# Altium schematic symbol library Sang_library.SchLib: 1607 symbols (part 12 of 15)
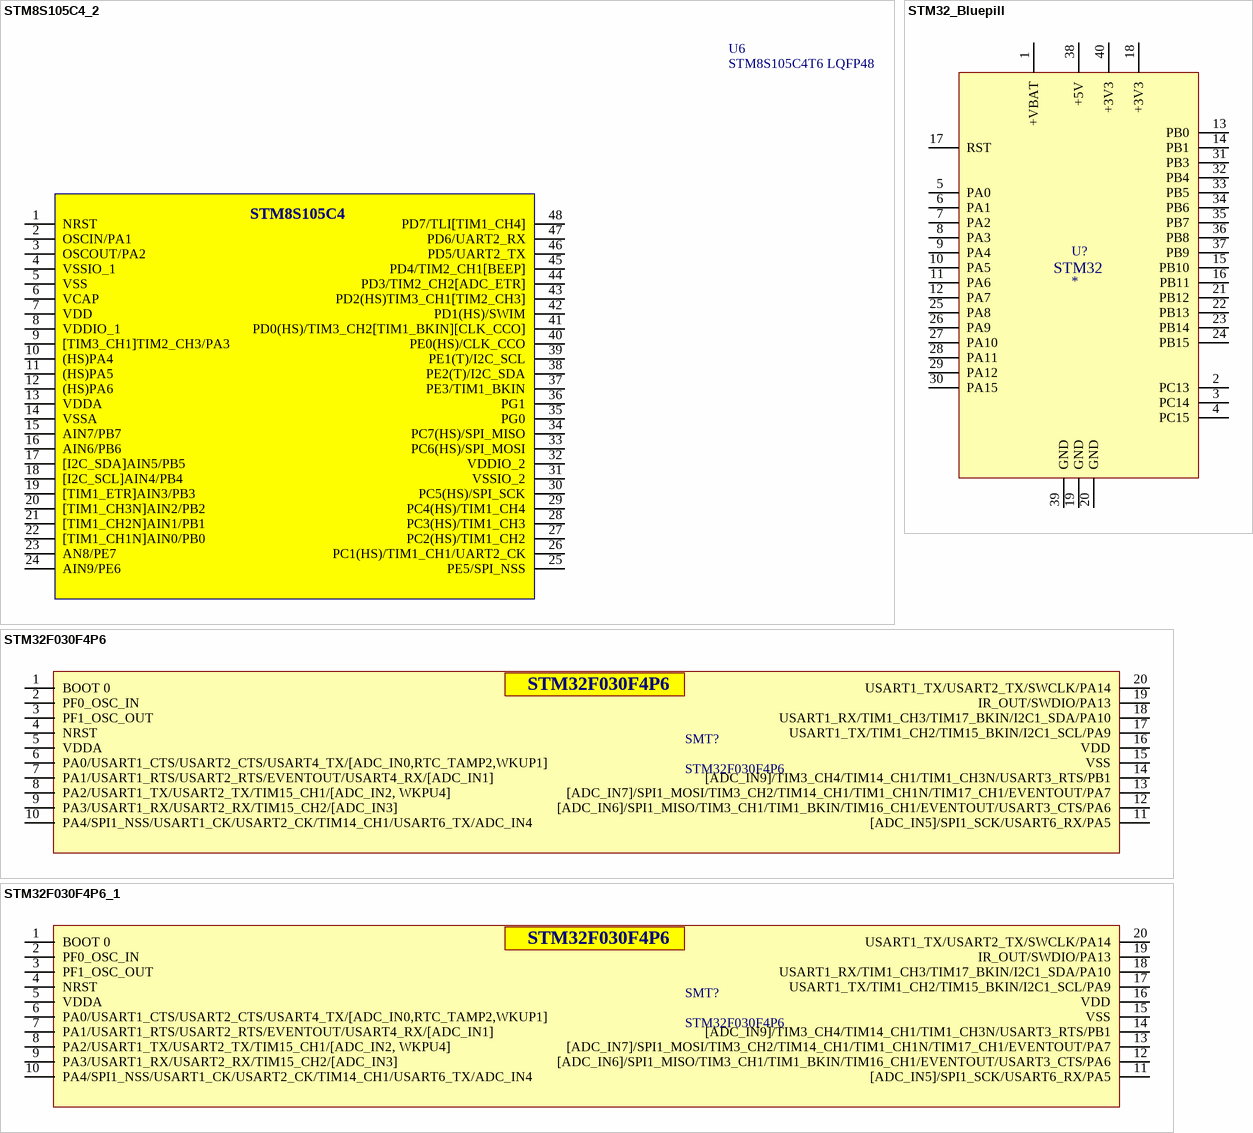
[diagram p108: symbols STM8S105C4_2 to STM32F030F4P6_1]

## STM32F030F4P6
designator SMT?
footprint TSSOP20 (Shrink Small Outline; 20 Leads; Body Width 4.4 mm; Pitch 0.65 mm)
pins: 1 BOOT 0, 2 PF0_OSC_IN, 3 PF1_OSC_OUT, 4 NRST, 5 VDDA, 6 PA0/USART1_CTS/USART2_CTS/USART4_TX/[ADC_IN0,RTC_TAMP2,WKUP1], 7 PA1/USART1_RTS/USART2_RTS/EVENTOUT/USART4_RX/[ADC_IN1], 8 PA2/USART1_TX/USART2_TX/TIM15_CH1/[ADC_IN2, WKPU4], 9 PA3/USART1_RX/USART2_RX/TIM15_CH2/[ADC_IN3], 10 PA4/SPI1_NSS/USART1_CK/USART2_CK/TIM14_CH1/USART6_TX/ADC_IN4, 11 [ADC_IN5]/SPI1_SCK/USART6_RX/PA5, 12 [ADC_IN6]/SPI1_MISO/TIM3_CH1/TIM1_BKIN/TIM16_CH1/EVENTOUT/USART3_CTS/PA6, 13 [ADC_IN7]/SPI1_MOSI/TIM3_CH2/TIM14_CH1/TIM1_CH1N/TIM17_CH1/EVENTOUT/PA7, 14 [ADC_IN9]/TIM3_CH4/TIM14_CH1/TIM1_CH3N/USART3_RTS/PB1, 15 VSS, 16 VDD, 17 USART1_TX/TIM1_CH2/TIM15_BKIN/I2C1_SCL/PA9, 18 USART1_RX/TIM1_CH3/TIM17_BKIN/I2C1_SDA/PA10, 19 IR_OUT/SWDIO/PA13, 20 USART1_TX/USART2_TX/SWCLK/PA14

## STM32F030F4P6_1
designator SMT?, comment STM32F030F4P6
footprint TSSOP20 (Shrink Small Outline; 20 Leads; Body Width 4.4 mm; Pitch 0.65 mm)
pins: 1 BOOT 0, 2 PF0_OSC_IN, 3 PF1_OSC_OUT, 4 NRST, 5 VDDA, 6 PA0/USART1_CTS/USART2_CTS/USART4_TX/[ADC_IN0,RTC_TAMP2,WKUP1], 7 PA1/USART1_RTS/USART2_RTS/EVENTOUT/USART4_RX/[ADC_IN1], 8 PA2/USART1_TX/USART2_TX/TIM15_CH1/[ADC_IN2, WKPU4], 9 PA3/USART1_RX/USART2_RX/TIM15_CH2/[ADC_IN3], 10 PA4/SPI1_NSS/USART1_CK/USART2_CK/TIM14_CH1/USART6_TX/ADC_IN4, 11 [ADC_IN5]/SPI1_SCK/USART6_RX/PA5, 12 [ADC_IN6]/SPI1_MISO/TIM3_CH1/TIM1_BKIN/TIM16_CH1/EVENTOUT/USART3_CTS/PA6, 13 [ADC_IN7]/SPI1_MOSI/TIM3_CH2/TIM14_CH1/TIM1_CH1N/TIM17_CH1/EVENTOUT/PA7, 14 [ADC_IN9]/TIM3_CH4/TIM14_CH1/TIM1_CH3N/USART3_RTS/PB1, 15 VSS, 16 VDD, 17 USART1_TX/TIM1_CH2/TIM15_BKIN/I2C1_SCL/PA9, 18 USART1_RX/TIM1_CH3/TIM17_BKIN/I2C1_SDA/PA10, 19 IR_OUT/SWDIO/PA13, 20 USART1_TX/USART2_TX/SWCLK/PA14

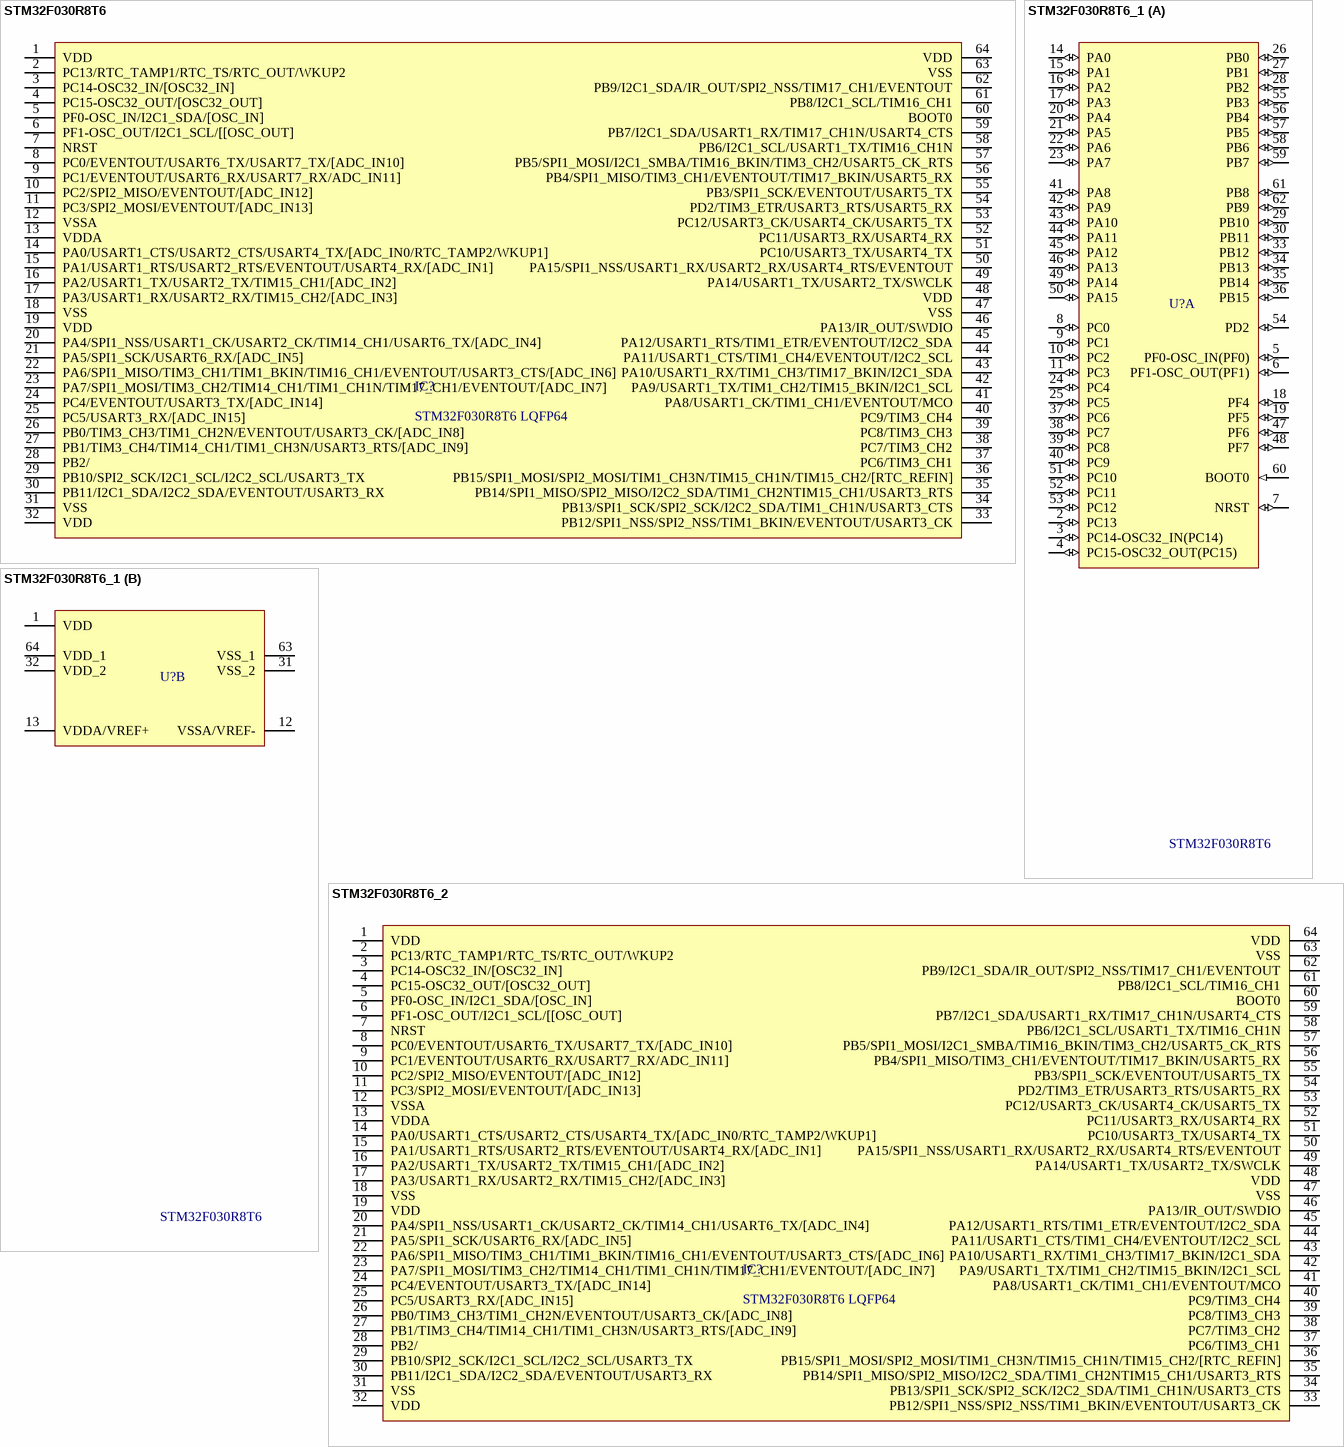
[diagram p75: symbols STM32F030R8T6 to STM32F030R8T6_2]

## STM32F030R8T6
designator IC?, comment STM32F030R8T6 LQFP64
Dán; Ghi_Chu: Con; Ma_Hang: MH005689; Ten_Linh_Kien: STM32F030R8T6 LQFP64; Don_Vi: *; Kieu_Chan: *; Chung_Loai: Dán
pins: 1 VDD, 2 PC13/RTC_TAMP1/RTC_TS/RTC_OUT/WKUP2, 3 PC14-OSC32_IN/[OSC32_IN], 4 PC15-OSC32_OUT/[OSC32_OUT], 5 PF0-OSC_IN/I2C1_SDA/[OSC_IN], 6 PF1-OSC_OUT/I2C1_SCL/[[OSC_OUT], 7 NRST, 8 PC0/EVENTOUT/USART6_TX/USART7_TX/[ADC_IN10], 9 PC1/EVENTOUT/USART6_RX/USART7_RX/ADC_IN11], 10 PC2/SPI2_MISO/EVENTOUT/[ADC_IN12], 11 PC3/SPI2_MOSI/EVENTOUT/[ADC_IN13], 12 VSSA, 13 VDDA, 14 PA0/USART1_CTS/USART2_CTS/USART4_TX/[ADC_IN0/RTC_TAMP2/WKUP1], 15 PA1/USART1_RTS/USART2_RTS/EVENTOUT/USART4_RX/[ADC_IN1], 16 PA2/USART1_TX/USART2_TX/TIM15_CH1/[ADC_IN2], 17 PA3/USART1_RX/USART2_RX/TIM15_CH2/[ADC_IN3], 18 VSS, 19 VDD, 20 PA4/SPI1_NSS/USART1_CK/USART2_CK/TIM14_CH1/USART6_TX/[ADC_IN4], 21 PA5/SPI1_SCK/USART6_RX/[ADC_IN5], 22 PA6/SPI1_MISO/TIM3_CH1/TIM1_BKIN/TIM16_CH1/EVENTOUT/USART3_CTS/[ADC_IN6], 23 PA7/SPI1_MOSI/TIM3_CH2/TIM14_CH1/TIM1_CH1N/TIM17_CH1/EVENTOUT/[ADC_IN7], 24 PC4/EVENTOUT/USART3_TX/[ADC_IN14], 25 PC5/USART3_RX/[ADC_IN15], 26 PB0/TIM3_CH3/TIM1_CH2N/EVENTOUT/USART3_CK/[ADC_IN8], 27 PB1/TIM3_CH4/TIM14_CH1/TIM1_CH3N/USART3_RTS/[ADC_IN9], 28 PB2/, 29 PB10/SPI2_SCK/I2C1_SCL/I2C2_SCL/USART3_TX, 30 PB11/I2C1_SDA/I2C2_SDA/EVENTOUT/USART3_RX, 31 VSS, 32 VDD, 33 PB12/SPI1_NSS/SPI2_NSS/TIM1_BKIN/EVENTOUT/USART3_CK, 34 PB13/SPI1_SCK/SPI2_SCK/I2C2_SDA/TIM1_CH1N/USART3_CTS, 35 PB14/SPI1_MISO/SPI2_MISO/I2C2_SDA/TIM1_CH2NTIM15_CH1/USART3_RTS, 36 PB15/SPI1_MOSI/SPI2_MOSI/TIM1_CH3N/TIM15_CH1N/TIM15_CH2/[RTC_REFIN], 37 PC6/TIM3_CH1, 38 PC7/TIM3_CH2, 39 PC8/TIM3_CH3, 40 PC9/TIM3_CH4, 41 PA8/USART1_CK/TIM1_CH1/EVENTOUT/MCO, 42 PA9/USART1_TX/TIM1_CH2/TIM15_BKIN/I2C1_SCL, 43 PA10/USART1_RX/TIM1_CH3/TIM17_BKIN/I2C1_SDA, 44 PA11/USART1_CTS/TIM1_CH4/EVENTOUT/I2C2_SCL, 45 PA12/USART1_RTS/TIM1_ETR/EVENTOUT/I2C2_SDA, 46 PA13/IR_OUT/SWDIO, 47 VSS, 48 VDD, 49 PA14/USART1_TX/USART2_TX/SWCLK, 50 PA15/SPI1_NSS/USART1_RX/USART2_RX/USART4_RTS/EVENTOUT, 51 PC10/USART3_TX/USART4_TX, 52 PC11/USART3_RX/USART4_RX, 53 PC12/USART3_CK/USART4_CK/USART5_TX, 54 PD2/TIM3_ETR/USART3_RTS/USART5_RX, 55 PB3/SPI1_SCK/EVENTOUT/USART5_TX, 56 PB4/SPI1_MISO/TIM3_CH1/EVENTOUT/TIM17_BKIN/USART5_RX, 57 PB5/SPI1_MOSI/I2C1_SMBA/TIM16_BKIN/TIM3_CH2/USART5_CK_RTS, 58 PB6/I2C1_SCL/USART1_TX/TIM16_CH1N, 59 PB7/I2C1_SDA/USART1_RX/TIM17_CH1N/USART4_CTS, 60 BOOT0, 61 PB8/I2C1_SCL/TIM16_CH1, 62 PB9/I2C1_SDA/IR_OUT/SPI2_NSS/TIM17_CH1/EVENTOUT, 63 VSS, 64 VDD

## STM32F030R8T6_1
designator U?, comment STM32F030R8T6
IC MCU 32BIT 64KB FLASH 64LQFP; MPN: STM32F030R8T6TR; Solder: SMT; Value: STM32F030R8T6; Category: IC
footprint LQFP-64 (Low Profile Quad Flat Pack (LQFP), 0.50 mm pitch; square, 16 pin X 16 pin, 10.00 mm L X 10.00 mm W X 1.60 mm H body)
part A pins: 2 PC13 (io) "PC13/TIM1_CH1N/WKUP2,RTC_TAMP1,RTC_TS,RTC_OUT", 3 PC14-OSC32_IN(PC14) (io) "PC14-OSC32_IN(PC14)/OSC32_IN", 4 PC15-OSC32_OUT(PC15) (io) "PC15-OSC32_OUT(PC15)/OSC32_OUT", 5 PF0-OSC_IN(PF0) (io) "PF0-OSC_IN(PF0)/TIM1_CH3N,I2C2_SDA/OSC_IN", 6 PF1-OSC_OUT(PF1) (io) "PF1-OSC_OUT(PF1)/I2C2_SCL/OSC_OUT", 7 NRST (io) "Device reset input / internal reset output (active low)", 8 PC0 (io) "PC0/EVENTOUT/ADC12_IN6,COMP7_INM", 9 PC1 (io) "PC1/EVENTOUT/ADC12_IN7,COMP7_INP", 10 PC2 (io) "PC2/COMP7_OUT,EVENTOUT/ADC12_IN8", 11 PC3 (io) "PC3/TIM1_BKIN2,EVENTOUT/ADC12_IN9", 14 PA0 (io) "PA0/USART2_CTS,TIM2_CH1_ETR,TIM8_BKIN,TIM8_ETR,TSC_G1_IO1,COMP1_OUT,EVENTOUT/ADC1_IN1,COMP1_INM,RTC_TAMP2,WKUP1,COMP7_INP", 15 PA1 (io) "PA1/USART2_RTS,TIM2_CH2,TSC_G1_IO2,TIM15_CH1N,RTC_REFIN,EVENTOUT/ADC1_IN2,COMP1_INP,OPAMP1_VINP,OPAMP3_VINP", 16 PA2 (io) "PA2/USART2_TX,TIM2_CH3,TIM15_CH1,TSC_G1_IO3,COMP2_OUT,EVENTOUT/ADC1_IN3,COMP2_INM,OPAMP1_VOUT", 17 PA3 (io) "PA3/USART2_RX,TIM2_CH4,TIM15_CH2,TSC_G1_IO4,EVENTOUT/ADC1_IN4,OPAMP1_VINP,COMP2_INP,OPAMP1_VINM", 18 PF4 (io) "PF4/COMP1_OUT,EVENTOUT/ADC1_IN5", 19 PF5 (io) "PF4/COMP1_OUT,EVENTOUT/ADC1_IN5", 20 PA4 (io) "PA4/SPI1_NSS,SPI3_NSS,I2S3_WS,USART2_CK,TSC_G2_IO1,TIM3_CH2,EVENTOUT/ADC2_IN1,DAC1_OUT1,OPAMP4_VINP,COMP1_INM,COMP2_INM,COMP3_INM,COMP4_INM,COMP5_INM,COMP6_INM,COMP7_INM", 21 PA5 (io) "PA5/SPI1_SCK,TIM2_CH1_ETR,TSC_G2_IO2,EVENTOUT/ADC2_IN2,DAC1_OUT2,OPAMP1_VINP,OPAMP2_VINM,OPAMP3_VINP,COMP1_INM,COMP2_INM,COMP3_INM,COMP4_INM,COMP5_INM,COMP6_INM,COMP7_INM", 22 PA6 (io) "PA6/SPI1_MISO,TIM3_CH1,TIM8_BKIN,TIM1_BKIN,TIM16_CH1,COMP1_OUT,TSC_G2_IO3,EVENTOUT/ADC2_IN3,OPAMP2_VOUT", 23 PA7 (io) "PA7/SPI1_MOSI,TIM3_CH2,TIM17_CH1,TIM1_CH1N,TIM8_CH1N,TSC_G2_IO4,COMP2_OUT,EVENTOUT/ADC2_IN4,COMP2_INP,OPAMP2_VINP,OPAMP1_VINP", 24 PC4 (io) "PC4/USART1_TX,EVENTOUT/ADC2_IN5", 25 PC5 (io) "PC5/USART1_RX,TSC_G3_IO1,EVENTOUT/ADC2_IN11,OPAMP2_VINM,OPAMP1_VINM", 26 PB0 (io) "PB0/TIM3_CH3,TIM1_CH2N,TIM8_CH2N,TSC_G3_IO2,EVENTOUT/ADC3_IN12,COMP4_INP,OPAMP3_VINP,OPAMP2_VINP", 27 PB1 (io) "PB1/TIM3_CH4,TIM1_CH3N,TIM8_CH3N,COMP4_OUT,TSC_G3_IO3,EVENTOUT/ADC3_IN1,OPAMP3_VOUT", 28 PB2 (io) "PB2/TSC_G3_IO4,EVENTOUT/ADC2_IN12,COMP4_INM,OPAMP3_VINM", 29 PB10 (io) "PB10/USART3_TX,TIM2_CH3,TSC_SYNC,EVENTOUT/COMP5_INM,OPAMP4_VINM,OPAMP3_VINM", 30 PB11 (io) "PB11/USART3_RX,TIM2_CH4,TSC_G6_IO1,EVENTOUT/COMP6_INP,OPAMP4_VINP", 33 PB12 (io) "PB12/SPI2_NSS,I2S2_WS,I2C2_SMBA,USART3_CK,TIM1_BKIN,TSC_G6_IO2,EVENTOUT/ADC4_IN3,COMP3_INM,OPAMP4_VOUT", 34 PB13 (io) "PB13/SPI2_SCK,I2S2_CK,USART3_CTS,TIM1_CH1N,TSC_G6_IO3,EVENTOUT/ADC3_IN5,COMP5_INP,OPAMP4_VINP,OPAMP3_VINP", 35 PB14 (io) "PB14/SPI2_MISO,I2S2ext_SD,USART3_RTS,TIM1_CH2N,TIM15_CH1,TSC_G6_IO4,EVENTOUT/COMP3_INP,ADC4_IN4,OPAMP2_VINP", 36 PB15 (io) "PB15/SPI2_MOSI,I2S2_SD,TIM1_CH3N,RTC_REFIN,TIM15_CH1N,TIM15_CH2,EVENTOUT/ADC4_IN5,COMP6_INM", 37 PC6 (io) "PC6/I2S2_MCK,COMP6_OUT,TIM8_CH1,TIM3_CH1,EVENTOUT", 38 PC7 (io) "PC7/I2S3_MCK,TIM8_CH2,TIM3_CH2,COMP5_OUT,EVENTOUT", 39 PC8 (io) "PC8/TIM8_CH3,TIM3_CH3,COMP3_OUT,EVENTOUT", 40 PC9 (io) "PC9/TIM8_CH4,TIM8_BKIN2,TIM3_CH4,I2S_CKIN,EVENTOUT", 41 PA8 (io) "PA8/I2C2_SMBA,I2S2_MCK,USART1_CK,TIM1_CH1,TIM4_ETR,MCO,COMP3_OUT,EVENTOUT", 42 PA9 (io) "PA9/I2C2_SCL,I2S3_MCK,USART1_TX,TIM1_CH2,TIM2_CH3,TIM15_BKIN,TSC_G4_IO1,COMP5_OUT,EVENTOUT", 43 PA10 (io) "PA10/I2C2_SDA,USART1_RX,TIM1_CH3,TIM2_CH4,TIM8_BKIN,TIM17_BKIN,TSC_G4_IO2,COMP6_OUT,EVENTOUT", 44 PA11 (io) "PA11/USART1_CTS,USB_DM,CAN_RX,TIM1_CH1N,TIM1_CH4,TIM1_BKIN2,TIM4_CH1,COMP1_OUT,EVENTOUT", 45 PA12 (io) "PA12/USART1_RTS,USB_DP,CAN_TX,TIM1_CH2N,TIM1_ETR,TIM4_CH2,TIM16_CH1,COMP2_OUT,EVENTOUT", 46 PA13 (io) "PA13/USART3_CTS,TIM4_CH3,TIM16_CH1N,TSC_G4_IO3,IR_OUT,SWDIO-JTMS,EVENTOUT", 47 PF6 (io) "PF4/COMP1_OUT,EVENTOUT/ADC1_IN5", 48 PF7 (io) "PF4/COMP1_OUT,EVENTOUT/ADC1_IN5", 49 PA14 (io) "PA14/I2C1_SDA,USART2_TX,TIM8_CH2,TIM1_BKIN,TSC_G4_IO4,SWCLK-JTCK,EVENTOUT", 50 PA15 (io) "PA15/I2C1_SCL,SPI1_NSS,SPI3_NSS,I2S3_WS,JTDI,USART2_RX,TIM1_BKIN,TIM2_CH1_ETR,TIM8_CH1,EVENTOUT", 51 PC10 (io) "PC10/SPI3_SCK,I2S3_CK,USART3_TX,UART4_TX,TIM8_CH1N,EVENTOUT", 52 PC11 (io) "PC11/SPI3_MISO,I2S3ext_SD,USART3_RX,UART4_RX,TIM8_CH2N,EVENTOUT", 53 PC12 (io) "PC12/SPI3_MOSI,I2S3_SD,USART3_CK,UART5_TX,TIM8_CH3N,EVENTOUT", 54 PD2 (io) "PD2/UART5_RX,TIM3_ETR,TIM8_BKIN,EVENTOUT", 55 PB3 (io) "PB3/SPI3_SCK,I2S3_CK,SPI1_SCK,USART2_TX,TIM2_CH2,TIM3_ETR,TIM4_ETR,TIM8_CH1N,TSC_G5_IO1,JTDO-TRACESWO,EVENTOUT", 56 PB4 (io) "PB4/SPI3_MISO,I2S3ext_SD,SPI1_MISO,USART2_RX,TIM3_CH1,TIM16_CH1,TIM17_BKIN,TIM8_CH2N,TSC_G5_IO2,NJTRST,EVENTOUT", 57 PB5 (io) "PB5/SPI3_MOSI,SPI1_MOSI,I2S3_SD,I2C1_SMBA,USART2_CK,TIM16_BKIN,TIM3_CH2,TIM8_CH3N,TIM17_CH1,EVENTOUT", 58 PB6 (io) "PB6/I2C1_SCL,USART1_TX,TIM16_CH1N,TIM4_CH1,TIM8_CH1,TSC_G5_IO3,TIM8_ETR,TIM8_BKIN2,EVENTOUT", 59 PB7 (io) "PB7/I2C1_SDA,USART1_RX,TIM3_CH4,TIM4_CH2,TIM17_CH1N,TIM8_BKIN,TSC_G5_IO4,EVENTOUT", 60 BOOT0 (in) "Boot memory selection", 61 PB8 (io) "PB8/I2C1_SCL,CAN_RX,TIM16_CH1,TIM4_CH3,TIM8_CH2,TIM1_BKIN,TSC_SYNC,COMP1_OUT,EVENTOUT", 62 PB9 (io) "PB9/I2C1_SDA,CAN_TX,TIM17_CH1,TIM4_CH4,TIM8_CH3,IR_OUT,COMP2_OUT,EVENTOUT"
part B pins: 1 VDD (power) "Backup power supply", 12 VSSA/VREF- (power) "Analog ground/Negative reference voltage", 13 VDDA/VREF+ (power) "Analog power supply/Positive reference voltage", 31 VSS_2 (power) "Digital ground", 32 VDD_2 (power) "Digital power supply", 63 VSS_1 (power) "Ground", 64 VDD_1 (power) "Digital power supply"

## STM32F030R8T6_2
designator IC?, comment STM32F030R8T6 LQFP64
Dán; Ghi_Chu: Con; Ma_Hang: MH005689; Ten_Linh_Kien: STM32F030R8T6 LQFP64; Don_Vi: *; Kieu_Chan: *; Chung_Loai: Dán
pins: 1 VDD, 2 PC13/RTC_TAMP1/RTC_TS/RTC_OUT/WKUP2, 3 PC14-OSC32_IN/[OSC32_IN], 4 PC15-OSC32_OUT/[OSC32_OUT], 5 PF0-OSC_IN/I2C1_SDA/[OSC_IN], 6 PF1-OSC_OUT/I2C1_SCL/[[OSC_OUT], 7 NRST, 8 PC0/EVENTOUT/USART6_TX/USART7_TX/[ADC_IN10], 9 PC1/EVENTOUT/USART6_RX/USART7_RX/ADC_IN11], 10 PC2/SPI2_MISO/EVENTOUT/[ADC_IN12], 11 PC3/SPI2_MOSI/EVENTOUT/[ADC_IN13], 12 VSSA, 13 VDDA, 14 PA0/USART1_CTS/USART2_CTS/USART4_TX/[ADC_IN0/RTC_TAMP2/WKUP1], 15 PA1/USART1_RTS/USART2_RTS/EVENTOUT/USART4_RX/[ADC_IN1], 16 PA2/USART1_TX/USART2_TX/TIM15_CH1/[ADC_IN2], 17 PA3/USART1_RX/USART2_RX/TIM15_CH2/[ADC_IN3], 18 VSS, 19 VDD, 20 PA4/SPI1_NSS/USART1_CK/USART2_CK/TIM14_CH1/USART6_TX/[ADC_IN4], 21 PA5/SPI1_SCK/USART6_RX/[ADC_IN5], 22 PA6/SPI1_MISO/TIM3_CH1/TIM1_BKIN/TIM16_CH1/EVENTOUT/USART3_CTS/[ADC_IN6], 23 PA7/SPI1_MOSI/TIM3_CH2/TIM14_CH1/TIM1_CH1N/TIM17_CH1/EVENTOUT/[ADC_IN7], 24 PC4/EVENTOUT/USART3_TX/[ADC_IN14], 25 PC5/USART3_RX/[ADC_IN15], 26 PB0/TIM3_CH3/TIM1_CH2N/EVENTOUT/USART3_CK/[ADC_IN8], 27 PB1/TIM3_CH4/TIM14_CH1/TIM1_CH3N/USART3_RTS/[ADC_IN9], 28 PB2/, 29 PB10/SPI2_SCK/I2C1_SCL/I2C2_SCL/USART3_TX, 30 PB11/I2C1_SDA/I2C2_SDA/EVENTOUT/USART3_RX, 31 VSS, 32 VDD, 33 PB12/SPI1_NSS/SPI2_NSS/TIM1_BKIN/EVENTOUT/USART3_CK, 34 PB13/SPI1_SCK/SPI2_SCK/I2C2_SDA/TIM1_CH1N/USART3_CTS, 35 PB14/SPI1_MISO/SPI2_MISO/I2C2_SDA/TIM1_CH2NTIM15_CH1/USART3_RTS, 36 PB15/SPI1_MOSI/SPI2_MOSI/TIM1_CH3N/TIM15_CH1N/TIM15_CH2/[RTC_REFIN], 37 PC6/TIM3_CH1, 38 PC7/TIM3_CH2, 39 PC8/TIM3_CH3, 40 PC9/TIM3_CH4, 41 PA8/USART1_CK/TIM1_CH1/EVENTOUT/MCO, 42 PA9/USART1_TX/TIM1_CH2/TIM15_BKIN/I2C1_SCL, 43 PA10/USART1_RX/TIM1_CH3/TIM17_BKIN/I2C1_SDA, 44 PA11/USART1_CTS/TIM1_CH4/EVENTOUT/I2C2_SCL, 45 PA12/USART1_RTS/TIM1_ETR/EVENTOUT/I2C2_SDA, 46 PA13/IR_OUT/SWDIO, 47 VSS, 48 VDD, 49 PA14/USART1_TX/USART2_TX/SWCLK, 50 PA15/SPI1_NSS/USART1_RX/USART2_RX/USART4_RTS/EVENTOUT, 51 PC10/USART3_TX/USART4_TX, 52 PC11/USART3_RX/USART4_RX, 53 PC12/USART3_CK/USART4_CK/USART5_TX, 54 PD2/TIM3_ETR/USART3_RTS/USART5_RX, 55 PB3/SPI1_SCK/EVENTOUT/USART5_TX, 56 PB4/SPI1_MISO/TIM3_CH1/EVENTOUT/TIM17_BKIN/USART5_RX, 57 PB5/SPI1_MOSI/I2C1_SMBA/TIM16_BKIN/TIM3_CH2/USART5_CK_RTS, 58 PB6/I2C1_SCL/USART1_TX/TIM16_CH1N, 59 PB7/I2C1_SDA/USART1_RX/TIM17_CH1N/USART4_CTS, 60 BOOT0, 61 PB8/I2C1_SCL/TIM16_CH1, 62 PB9/I2C1_SDA/IR_OUT/SPI2_NSS/TIM17_CH1/EVENTOUT, 63 VSS, 64 VDD

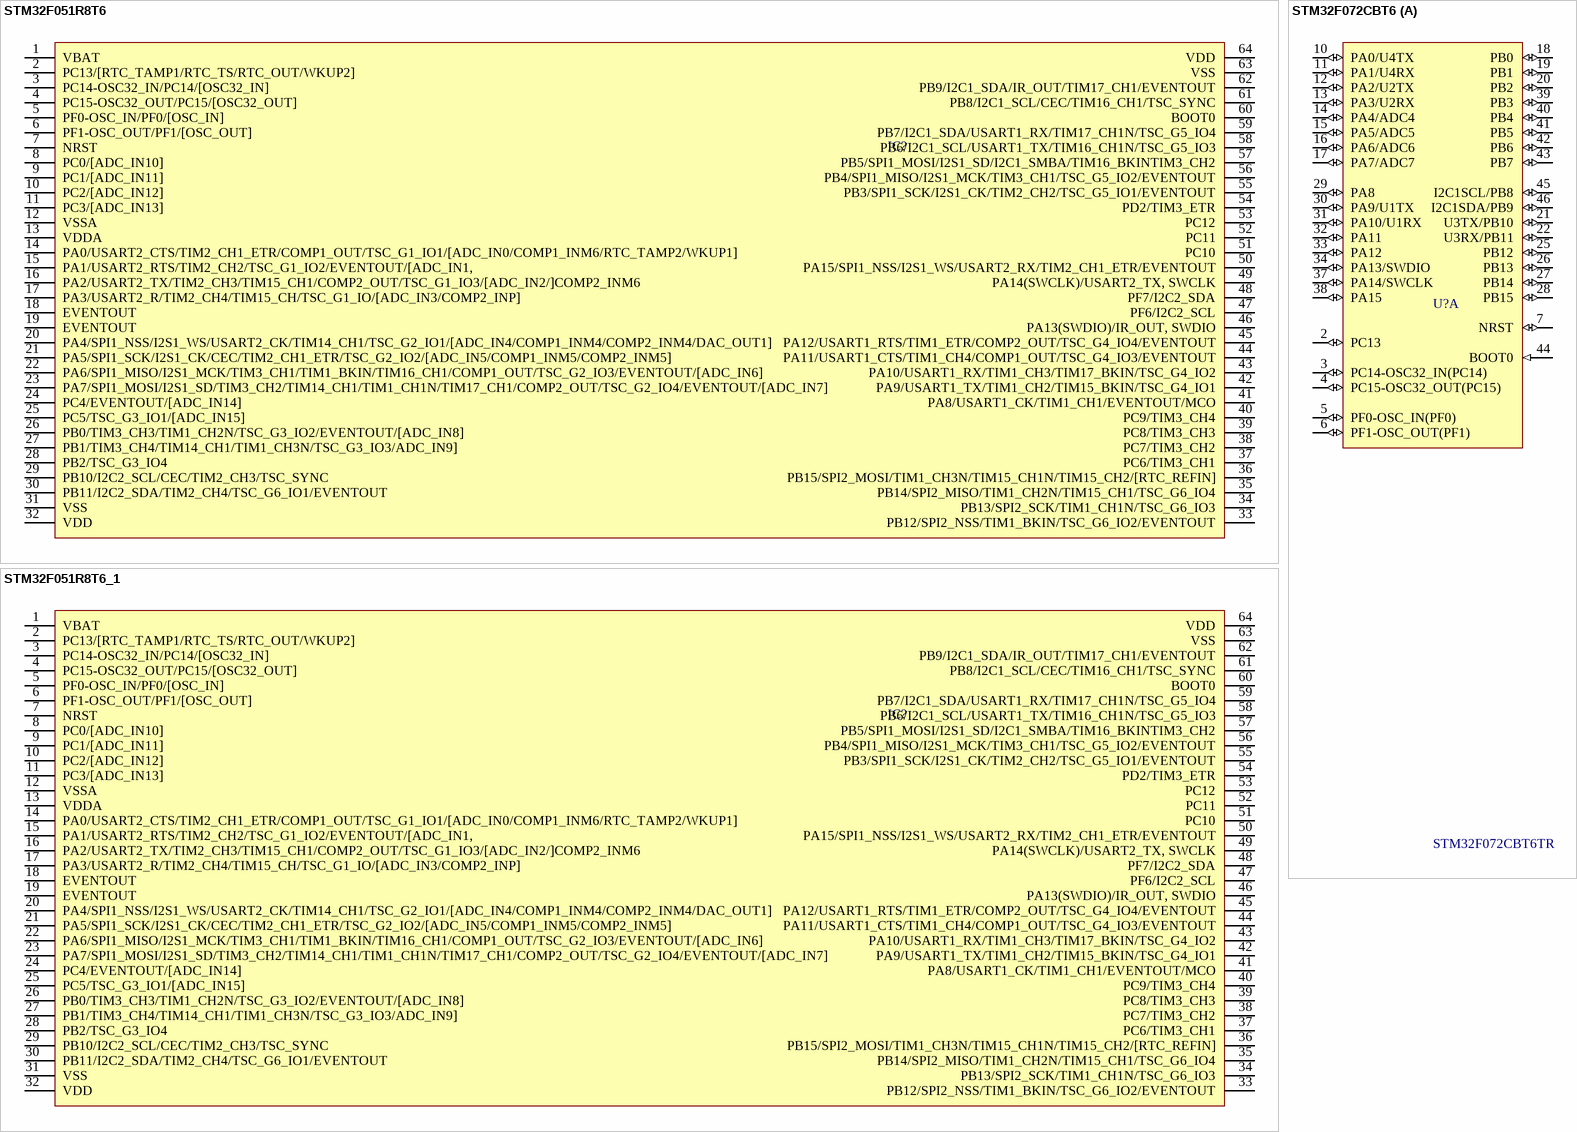
[diagram p76: symbols STM32F051R8T6 to STM32F072CBT6]

## STM32F051R8T6
designator IC?, comment STM32F051R8T6 LQFP64  (value not drawn)
Dán; Don_Vi: Con; Ma_Hang: MH005691; Ten_Linh_Kien: STM32F051R8T6 LQFP64; Ghi _Chu: *; Kieu_Chan: *; Chung_Loai: Dán
pins: 1 VBAT, 2 PC13/[RTC_TAMP1/RTC_TS/RTC_OUT/WKUP2], 3 PC14-OSC32_IN/PC14/[OSC32_IN], 4 PC15-OSC32_OUT/PC15/[OSC32_OUT], 5 PF0-OSC_IN/PF0/[OSC_IN], 6 PF1-OSC_OUT/PF1/[OSC_OUT], 7 NRST, 8 PC0/[ADC_IN10], 9 PC1/[ADC_IN11], 10 PC2/[ADC_IN12], 11 PC3/[ADC_IN13], 12 VSSA, 13 VDDA, 14 PA0/USART2_CTS/TIM2_CH1_ETR/COMP1_OUT/TSC_G1_IO1/[ADC_IN0/COMP1_INM6/RTC_TAMP2/WKUP1], 15 PA1/USART2_RTS/TIM2_CH2/TSC_G1_IO2/EVENTOUT/[ADC_IN1,, 16 PA2/USART2_TX/TIM2_CH3/TIM15_CH1/COMP2_OUT/TSC_G1_IO3/[ADC_IN2/]COMP2_INM6, 17 PA3/USART2_R/TIM2_CH4/TIM15_CH/TSC_G1_IO/[ADC_IN3/COMP2_INP], 18 EVENTOUT, 19 EVENTOUT , 20 PA4/SPI1_NSS/I2S1_WS/USART2_CK/TIM14_CH1/TSC_G2_IO1/[ADC_IN4/COMP1_INM4/COMP2_INM4/DAC_OUT1], 21 PA5/SPI1_SCK/I2S1_CK/CEC/TIM2_CH1_ETR/TSC_G2_IO2/[ADC_IN5/COMP1_INM5/COMP2_INM5], 22 PA6/SPI1_MISO/I2S1_MCK/TIM3_CH1/TIM1_BKIN/TIM16_CH1/COMP1_OUT/TSC_G2_IO3/EVENTOUT/[ADC_IN6], 23 PA7/SPI1_MOSI/I2S1_SD/TIM3_CH2/TIM14_CH1/TIM1_CH1N/TIM17_CH1/COMP2_OUT/TSC_G2_IO4/EVENTOUT/[ADC_IN7], 24 PC4/EVENTOUT/[ADC_IN14], 25 PC5/TSC_G3_IO1/[ADC_IN15], 26 PB0/TIM3_CH3/TIM1_CH2N/TSC_G3_IO2/EVENTOUT/[ADC_IN8], 27 PB1/TIM3_CH4/TIM14_CH1/TIM1_CH3N/TSC_G3_IO3/ADC_IN9], 28 PB2/TSC_G3_IO4, 29 PB10/I2C2_SCL/CEC/TIM2_CH3/TSC_SYNC, 30 PB11/I2C2_SDA/TIM2_CH4/TSC_G6_IO1/EVENTOUT, 31 VSS, 32 VDD, 33 PB12/SPI2_NSS/TIM1_BKIN/TSC_G6_IO2/EVENTOUT, 34 PB13/SPI2_SCK/TIM1_CH1N/TSC_G6_IO3, 35 PB14/SPI2_MISO/TIM1_CH2N/TIM15_CH1/TSC_G6_IO4, 36 PB15/SPI2_MOSI/TIM1_CH3N/TIM15_CH1N/TIM15_CH2/[RTC_REFIN], 37 PC6/TIM3_CH1, 38 PC7/TIM3_CH2, 39 PC8/TIM3_CH3, 40 PC9/TIM3_CH4, 41 PA8/USART1_CK/TIM1_CH1/EVENTOUT/MCO, 42 PA9/USART1_TX/TIM1_CH2/TIM15_BKIN/TSC_G4_IO1, 43 PA10/USART1_RX/TIM1_CH3/TIM17_BKIN/TSC_G4_IO2, 44 PA11/USART1_CTS/TIM1_CH4/COMP1_OUT/TSC_G4_IO3/EVENTOUT, 45 PA12/USART1_RTS/TIM1_ETR/COMP2_OUT/TSC_G4_IO4/EVENTOUT, 46 PA13(SWDIO)/IR_OUT, SWDIO, 47 PF6/I2C2_SCL, 48 PF7/I2C2_SDA, 49 PA14(SWCLK)/USART2_TX, SWCLK, 50 PA15/SPI1_NSS/I2S1_WS/USART2_RX/TIM2_CH1_ETR/EVENTOUT, 51 PC10, 52 PC11, 53 PC12, 54 PD2/TIM3_ETR, 55 PB3/SPI1_SCK/I2S1_CK/TIM2_CH2/TSC_G5_IO1/EVENTOUT, 56 PB4/SPI1_MISO/I2S1_MCK/TIM3_CH1/TSC_G5_IO2/EVENTOUT, 57 PB5/SPI1_MOSI/I2S1_SD/I2C1_SMBA/TIM16_BKINTIM3_CH2, 58 PB6/I2C1_SCL/USART1_TX/TIM16_CH1N/TSC_G5_IO3, 59 PB7/I2C1_SDA/USART1_RX/TIM17_CH1N/TSC_G5_IO4, 60 BOOT0, 61 PB8/I2C1_SCL/CEC/TIM16_CH1/TSC_SYNC, 62 PB9/I2C1_SDA/IR_OUT/TIM17_CH1/EVENTOUT, 63 VSS, 64 VDD

## STM32F051R8T6_1
designator IC?, comment STM32F051R8T6 LQFP64  (value not drawn)
Dán; Don_Vi: Con; Ma_Hang: MH005691; Ten_Linh_Kien: STM32F051R8T6 LQFP64; Ghi _Chu: *; Kieu_Chan: *; Chung_Loai: Dán
pins: 1 VBAT, 2 PC13/[RTC_TAMP1/RTC_TS/RTC_OUT/WKUP2], 3 PC14-OSC32_IN/PC14/[OSC32_IN], 4 PC15-OSC32_OUT/PC15/[OSC32_OUT], 5 PF0-OSC_IN/PF0/[OSC_IN], 6 PF1-OSC_OUT/PF1/[OSC_OUT], 7 NRST, 8 PC0/[ADC_IN10], 9 PC1/[ADC_IN11], 10 PC2/[ADC_IN12], 11 PC3/[ADC_IN13], 12 VSSA, 13 VDDA, 14 PA0/USART2_CTS/TIM2_CH1_ETR/COMP1_OUT/TSC_G1_IO1/[ADC_IN0/COMP1_INM6/RTC_TAMP2/WKUP1], 15 PA1/USART2_RTS/TIM2_CH2/TSC_G1_IO2/EVENTOUT/[ADC_IN1,, 16 PA2/USART2_TX/TIM2_CH3/TIM15_CH1/COMP2_OUT/TSC_G1_IO3/[ADC_IN2/]COMP2_INM6, 17 PA3/USART2_R/TIM2_CH4/TIM15_CH/TSC_G1_IO/[ADC_IN3/COMP2_INP], 18 EVENTOUT, 19 EVENTOUT , 20 PA4/SPI1_NSS/I2S1_WS/USART2_CK/TIM14_CH1/TSC_G2_IO1/[ADC_IN4/COMP1_INM4/COMP2_INM4/DAC_OUT1], 21 PA5/SPI1_SCK/I2S1_CK/CEC/TIM2_CH1_ETR/TSC_G2_IO2/[ADC_IN5/COMP1_INM5/COMP2_INM5], 22 PA6/SPI1_MISO/I2S1_MCK/TIM3_CH1/TIM1_BKIN/TIM16_CH1/COMP1_OUT/TSC_G2_IO3/EVENTOUT/[ADC_IN6], 23 PA7/SPI1_MOSI/I2S1_SD/TIM3_CH2/TIM14_CH1/TIM1_CH1N/TIM17_CH1/COMP2_OUT/TSC_G2_IO4/EVENTOUT/[ADC_IN7], 24 PC4/EVENTOUT/[ADC_IN14], 25 PC5/TSC_G3_IO1/[ADC_IN15], 26 PB0/TIM3_CH3/TIM1_CH2N/TSC_G3_IO2/EVENTOUT/[ADC_IN8], 27 PB1/TIM3_CH4/TIM14_CH1/TIM1_CH3N/TSC_G3_IO3/ADC_IN9], 28 PB2/TSC_G3_IO4, 29 PB10/I2C2_SCL/CEC/TIM2_CH3/TSC_SYNC, 30 PB11/I2C2_SDA/TIM2_CH4/TSC_G6_IO1/EVENTOUT, 31 VSS, 32 VDD, 33 PB12/SPI2_NSS/TIM1_BKIN/TSC_G6_IO2/EVENTOUT, 34 PB13/SPI2_SCK/TIM1_CH1N/TSC_G6_IO3, 35 PB14/SPI2_MISO/TIM1_CH2N/TIM15_CH1/TSC_G6_IO4, 36 PB15/SPI2_MOSI/TIM1_CH3N/TIM15_CH1N/TIM15_CH2/[RTC_REFIN], 37 PC6/TIM3_CH1, 38 PC7/TIM3_CH2, 39 PC8/TIM3_CH3, 40 PC9/TIM3_CH4, 41 PA8/USART1_CK/TIM1_CH1/EVENTOUT/MCO, 42 PA9/USART1_TX/TIM1_CH2/TIM15_BKIN/TSC_G4_IO1, 43 PA10/USART1_RX/TIM1_CH3/TIM17_BKIN/TSC_G4_IO2, 44 PA11/USART1_CTS/TIM1_CH4/COMP1_OUT/TSC_G4_IO3/EVENTOUT, 45 PA12/USART1_RTS/TIM1_ETR/COMP2_OUT/TSC_G4_IO4/EVENTOUT, 46 PA13(SWDIO)/IR_OUT, SWDIO, 47 PF6/I2C2_SCL, 48 PF7/I2C2_SDA, 49 PA14(SWCLK)/USART2_TX, SWCLK, 50 PA15/SPI1_NSS/I2S1_WS/USART2_RX/TIM2_CH1_ETR/EVENTOUT, 51 PC10, 52 PC11, 53 PC12, 54 PD2/TIM3_ETR, 55 PB3/SPI1_SCK/I2S1_CK/TIM2_CH2/TSC_G5_IO1/EVENTOUT, 56 PB4/SPI1_MISO/I2S1_MCK/TIM3_CH1/TSC_G5_IO2/EVENTOUT, 57 PB5/SPI1_MOSI/I2S1_SD/I2C1_SMBA/TIM16_BKINTIM3_CH2, 58 PB6/I2C1_SCL/USART1_TX/TIM16_CH1N/TSC_G5_IO3, 59 PB7/I2C1_SDA/USART1_RX/TIM17_CH1N/TSC_G5_IO4, 60 BOOT0, 61 PB8/I2C1_SCL/CEC/TIM16_CH1/TSC_SYNC, 62 PB9/I2C1_SDA/IR_OUT/TIM17_CH1/EVENTOUT, 63 VSS, 64 VDD